# Altium schematic symbol library BARKO_SCHLIB.SchLib: 1064 symbols (part 5 of 11)
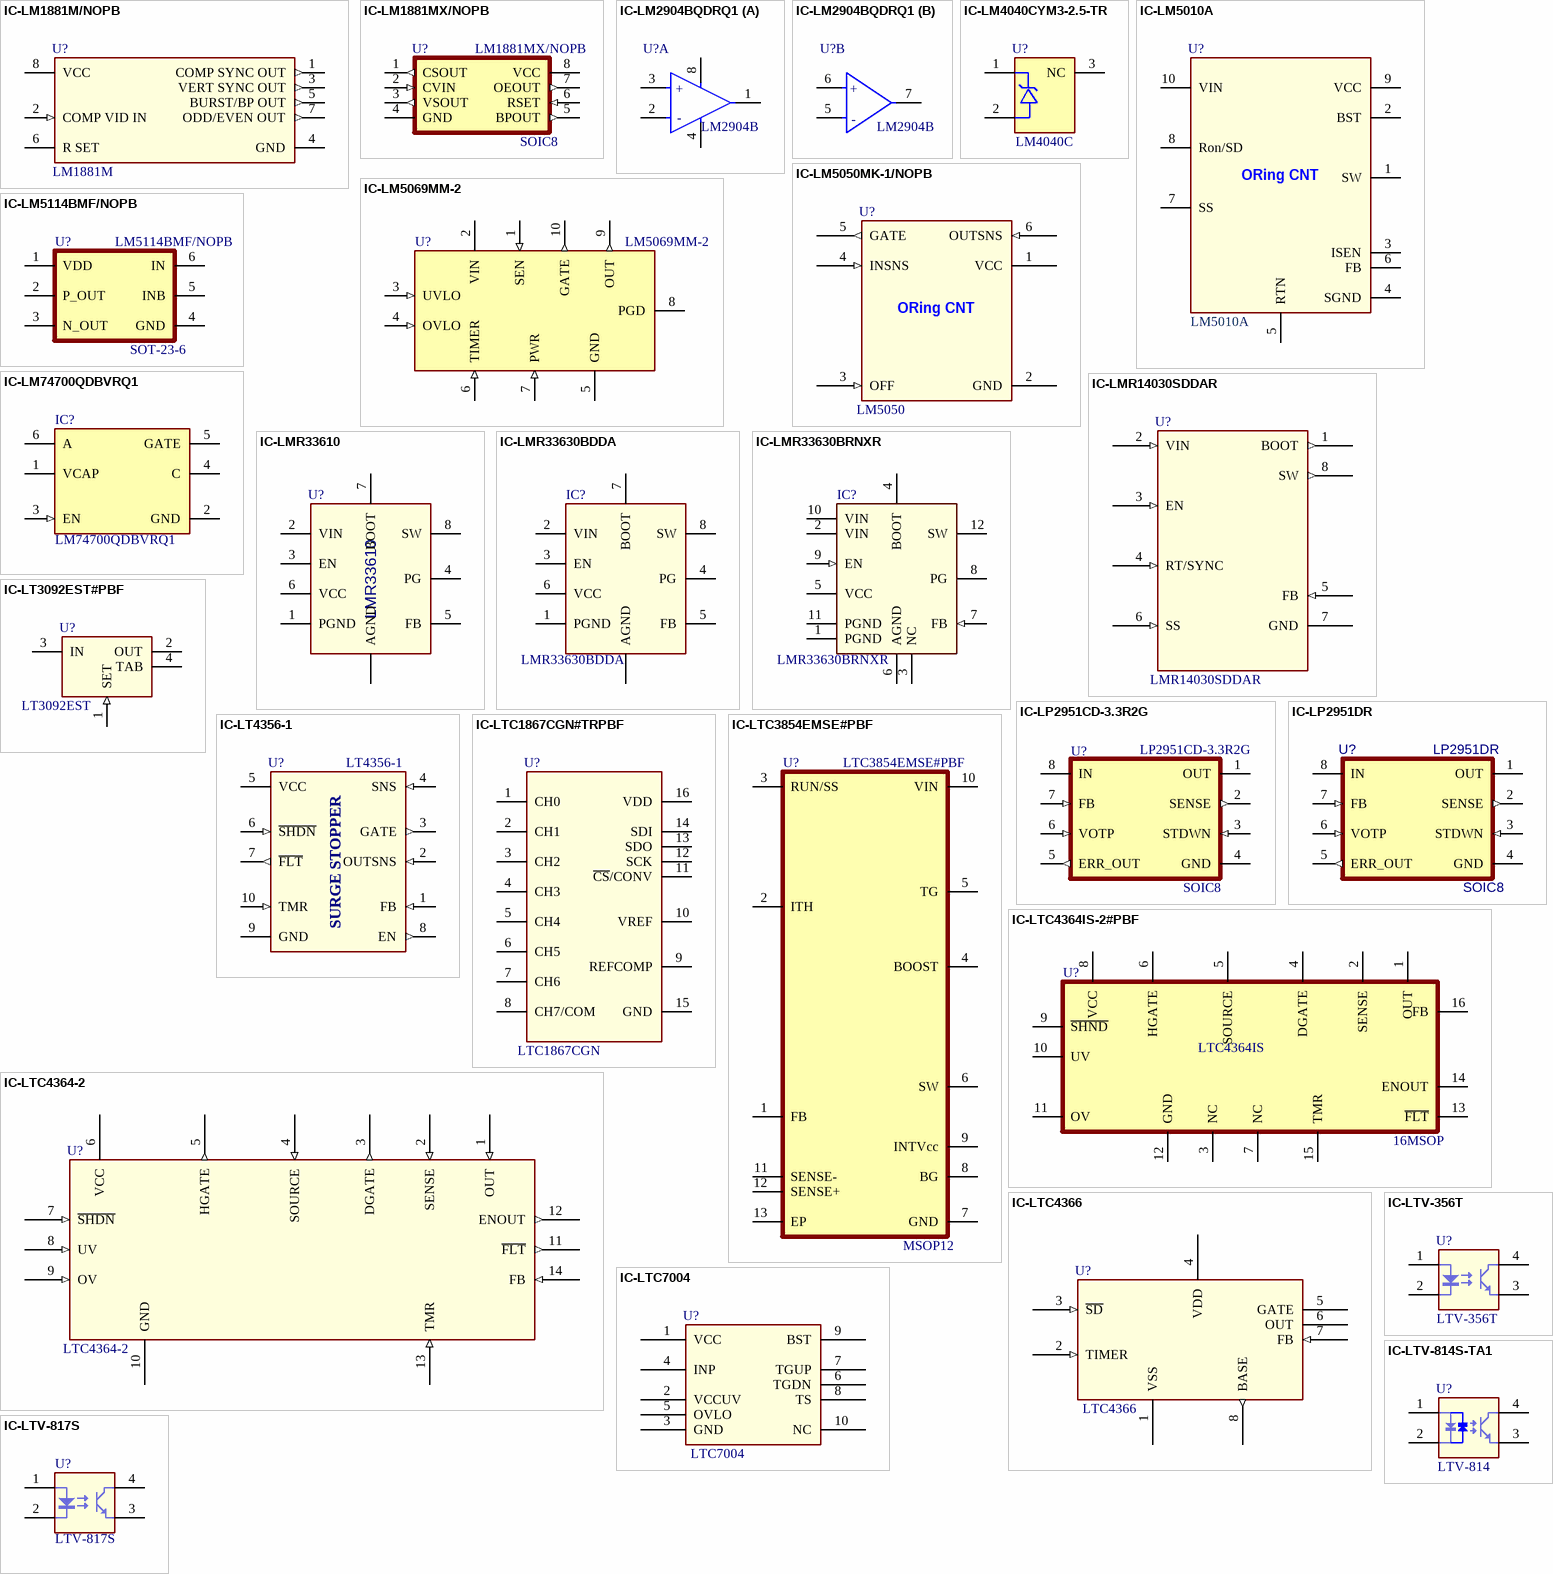
[diagram p45: symbols IC-LM1881M/NOPB to IC-LTV-817S]

## IC-LM4040CYM3-2.5-TR
designator U?, comment LM4040C
IC VREF SHUNT 0.5% SOT23-3; Manufacturer: Microchip; Manufacturer Part Number: LM4040CYM3-2.5-TR; Min Output Voltage: 2.5V; Output Current: 15mA; Temperature Coefficient: 100ppm/°C; Cathode Current: 65uA; Number of Channels: 1; Output Type: Fixed; Supplier 1: Digi-Key; Supplier Part Number 1: 576-1046-1-ND; Stock: 8428; Pricing: 1=0.32, 25=0.26, 100=0.24 (USD); RoHS: Yes; Mount: Surface Mount; Case/Package: TO-236-3; Number of Pins: 3; Min Operating Temperature: -40°C; Max Operating Temperature: 85°C; Packaging: Cut Tape; Reference Voltage: 2.5V; Tolerance: 0.5%; Output Voltage: 2.5V; Reference Type: Shunt; REACH SVHC: No SVHC; Lead Free: Lead Free; ComponentLink1URL: https://datasheet.ciiva.com/16388/mic23051-16388546.pdf?src-supplier=Future+Electronics; ComponentLink1Description: https://datasheet.ciiva.com/16388/mic23051-16388546.pdf?src-supplier=Future+Electronics; ComponentLink2URL: https://datasheet.ciiva.com/1173/1580463-1173207.pdf?src-supplier=Element14; ComponentLink2Description: https://datasheet.ciiva.com/1173/1580463-1173207.pdf?src-supplier=Element14
footprint SOT23-3
pins: 1 +, 2 -, 3 NC

## IC-LM5010A
designator U?, comment LM5010A
IC REG BUCK ADJUSTABLE 1A 10WSON; Manufacturer: TI National Semiconductor; Manufacturer Part Number: LM5010ASD/NOPB; Output Voltage: 70V; Switching Frequency: 1MHz; Number of Outputs: 1; Efficiency: 91%; Min Input Voltage: 6V; Max Input Voltage: 75V; Synchronous Rectifier: No; Min Output Voltage: 2.5V; Quiescent Current: 650uA; Supplier 1: Digi-Key; Stock 1: 6898; Pricing 1: 1=3,43000, 10=3,08000, 25=2,91160, 100=2,39390, 250=2,14804, 500=2,07040 (USD); RoHS: Yes; Mount: Surface Mount; Number of Pins: 10; Contact Plating: Tin,Matte; Min Operating Temperature: -40°C; Max Operating Temperature: 150°C; Max Output Current: 1A; Output Current: 1A; Package Quantity: 1000; Packaging: Tape and Reel; Max Output Voltage: 70V; Output Type: Adjustable; Max Supply Voltage: 75V; Min Supply Voltage: 6V; Frequency: 1MHz; Termination: SMD/SMT; Length: 4mm; Height: 0.8mm; Width: 4mm; Radiation Hardening: No; Lead Free: Lead Free; REACH SVHC: No SVHC; ComponentLink1URL: https://datasheet.ciiva.com/22755/1814939-22755746.pdf?src-supplier=Farnell; ComponentLink1Description: https://datasheet.ciiva.com/22755/1814939-22755746.pdf?src-supplier=Farnell; ComponentLink2URL: https://datasheet.ciiva.com/25627/0900766b810fa582-25627522.pdf?src-supplier=RSComponents; ComponentLink2Description: https://datasheet.ciiva.com/25627/0900766b810fa582-25627522.pdf?src-supplier=RSComponents; ComponentLink3URL: https://datasheet.ciiva.com/27052/1471525-27052267.pdf?src-supplier=Jameco; ComponentLink3Description: https://datasheet.ciiva.com/27052/1471525-27052267.pdf?src-supplier=Jameco; ComponentLink4URL: https://datasheet.ciiva.com/6597/lm5010a-6597237.pdf?src-supplier=Digi-Key; ComponentLink4Description: https://datasheet.ciiva.com/6597/lm5010a-6597237.pdf?src-supplier=Digi-Key; ComponentLink5URL: https://datasheet.ciiva.com/22684/1886233-22684613.pdf?src-supplier=Element14; ComponentLink5Description: https://datasheet.ciiva.com/22684/1886233-22684613.pdf?src-supplier=Element14; ComponentLink6URL: https://datasheet.ciiva.com/6597/lm5010a-6597240.pdf?src-supplier=Digi-Key; ComponentLink6Description: https://datasheet.ciiva.com/6597/lm5010a-6597240.pdf?src-supplier=Digi-Key; ComponentLink7URL: https://datasheet.ciiva.com/3229/lm5010a-3229963.pdf?src-supplier=Avnet; ComponentLink7Description: https://datasheet.ciiva.com/3229/lm5010a-3229963.pdf?src-supplier=Avnet; ComponentLink8URL: https://datasheet.ciiva.com/6597/lm5010a-6597243.pdf?src-supplier=Digi-Key; ComponentLink8Description: https://datasheet.ciiva.com/6597/lm5010a-6597243.pdf?src-supplier=Digi-Key; Supplier Part Number 1: 296-LM5010ASD/NOPBCT-ND
footprint SON80P400X80_HS-11N (SON, 10-Leads, Body 4,00x4,00mm, Pitch 0,80mm, Thermal Pad 3,00x2,09mm, IPC Medium Density)
pins: 1 SW, 2 BST, 3 ISEN, 4 SGND, 5 RTN, 6 FB, 7 SS, 8 Ron/SD, 9 VCC, 10 VIN
text: ORing CNT

## IC-LM5050MK-1/NOPB
designator U?, comment LM5050
IC OR CTRLR N+1 6SOT; Manufacturer: TI National Semiconductor; Manufacturer Part Number: LM5050MK-1/NOPB; Min Supply Voltage: 5V; Max Supply Voltage: 75V; Number of Outputs: 1; Quiescent Current: 400uA; Operating Supply Current: 130uA; Turn-Off Delay Time: 486ns; Output Current: 3.2uA; Washability: OK; Tolerance: 1%; Resistance: 24.9kR; Power Rating: 100mW; Temperature Coefficient: 100ppm/°C; .Creator: M.OZKAN; .PCBCHK: USED; Supplier 1: Digi-Key; Stock 1: 33499; Pricing 1: 1=2.33000, 10=2.09100, 25=1.97240, 100=1.57800, 250=1.38072, 500=1.34126 (USD); RoHS: Yes; Mount: Surface Mount; Case/Package: SOT-23-6; Number of Pins: 6; Min Operating Temperature: -40°C; Max Operating Temperature: 125°C; Packaging: Tape and Reel; Package Quantity: 1000; Nominal Supply Current: 130uA; Number of Drivers: 1; Max Output Current: 3.2uA; Output Voltage: 75V; Radiation Hardening: No; Lead Free: Lead Free; REACH SVHC: No SVHC; ComponentLink1URL: https://datasheet.ciiva.com/22694/1642225-22694320.pdf?src-supplier=Element14; ComponentLink1Description: https://datasheet.ciiva.com/22694/1642225-22694320.pdf?src-supplier=Element14; ComponentLink2URL: https://datasheet.ciiva.com/12085/lm5050-1-122886-12085154.pdf?src-supplier=Mouser; ComponentLink2Description: https://datasheet.ciiva.com/12085/lm5050-1-122886-12085154.pdf?src-supplier=Mouser; ComponentLink3URL: https://datasheet.ciiva.com/1960/lm5050-1-1960856.pdf?src-supplier=Digi-Key; ComponentLink3Description: https://datasheet.ciiva.com/1960/lm5050-1-1960856.pdf?src-supplier=Digi-Key; ComponentLink4URL: https://datasheet.ciiva.com/15110/getdatasheetpartid-319925-15110173.pdf?src-supplier=Verical; ComponentLink4Description: https://datasheet.ciiva.com/15110/getdatasheetpartid-319925-15110173.pdf?src-supplier=Verical; ComponentLink5URL: https://datasheet.ciiva.com/1960/lm5050-1-1960857.pdf?src-supplier=Digi-Key; ComponentLink5Description: https://datasheet.ciiva.com/1960/lm5050-1-1960857.pdf?src-supplier=Digi-Key; ComponentLink6URL: https://datasheet.ciiva.com/1960/lm5050-1-1960858.pdf?src-supplier=Digi-Key; ComponentLink6Description: https://datasheet.ciiva.com/1960/lm5050-1-1960858.pdf?src-supplier=Digi-Key; Supplier Part Number 1: LM5050MK-1/NOPBCT-ND; Stock: 149638; Pricing: 1=0.1, 10=0.016, 100=0.0065, 1000=0.0029, 2500=0.0025 (USD); Case Code (Imperial): 0603; Contact Plating: Tin,Matte; Case Code (Metric): 1608; Composition: Thick Film; Number of Terminations: 2; Max Power Dissipation: 100mW; Features: Automotive AEC-Q200; Length: 0.061inch; Height: 0.022inch; Width: 0.031inch; ComponentLink7URL: http://components.arrow.com/part/dataview/50576347S797719N1174?src-supplier=Arrow; ComponentLink7Description: http://components.arrow.com/part/dataview/50576347S797719N1174?src-supplier=Arrow; ComponentLink8URL: http://www.seielect.com/Catalog/SEI-RMC.pdf?src-supplier=Future+Electronics; ComponentLink8Description: http://www.seielect.com/Catalog/SEI-RMC.pdf?src-supplier=Future+Electronics; ComponentLink9URL: https://www.seielect.com/catalog/SEI-RMCF_RMCP.pdf?src-supplier=Avnet; ComponentLink9Description: https://www.seielect.com/catalog/SEI-RMCF_RMCP.pdf?src-supplier=Avnet; ComponentLink10URL: https://www.seielect.com/catalog/SEI-Packaging.pdf?src-supplier=Digi-Key; ComponentLink10Description: https://www.seielect.com/catalog/SEI-Packaging.pdf?src-supplier=Digi-Key; ComponentLink11URL: https://www.seielect.com/catalog/SEI-RMCF_RMCP.pdf?src-supplier=Avnet+Asia; ComponentLink11Description: https://www.seielect.com/catalog/SEI-RMCF_RMCP.pdf?src-supplier=Avnet+Asia; ComponentLink12URL: https://www.seielect.com/Catalog/SEI-RMCF_RMCP.pdf?src-supplier=Digi-Key; ComponentLink12Description: https://www.seielect.com/Catalog/SEI-RMCF_RMCP.pdf?src-supplier=Digi-Key; .SCHCHK: USED
footprint SOT23-6
pins: 1 VCC (power), 2 GND (power), 3 OFF (in), 4 INSNS (in), 5 GATE (out), 6 OUTSNS (in)
text: ORing CNT

## IC-LM5069MM-2
designator U?, comment LM5069MM-2
Hot Swap Controller 1-CH 80V N-Channel Positive High Voltage 10-Pin VSSOP T/R; Manufacturer: National Semiconductor; Manufacturer Part Number: LM5069MM-2/NOPB; PackageTopMarking: ZXTT*SNBB; PowerWise: N; CompType: MiscPower; High-Reliability: Y; Min Supply Voltage: 9V; Number of Channels: 1; Output Voltage: 12V; Washability: OK; .Creator: M.OZKAN; .PCBCHK: USED; DatasheetVersion: Mar-2008; PackageVersion: revB, Jul-2003; PackageReference: MUB10A; PackageDescription: Mini-SO, Molded, .118 x .118 x .034in Body, 10 Lead, .0197in Pitch; PartNumber: LM5069MM-2; RoHS: N; PinCount: 10; Code_JEDEC: MO-187-BA; ComponentLink1Description: Manufacturer URL; ComponentLink1URL: http://www.national.com/; ComponentLink2Description: LM5069 Datasheet; ComponentLink2URL: http://www.national.com/ds/LM/LM5069.pdf; ComponentLink3Description: LM5069 Web Page; ComponentLink3URL: http://www.national.com/pf/LM/LM5069.html; ComponentLink4Description: MUB10A Package Page; ComponentLink4URL: http://www.national.com/packaging/folders/mub10a.html; Supplier 1: Digi-Key; Stock 1: 60493; Pricing 1: 1 = 3.00000, 10 = 2.69700, 100 = 2.20940, 500 = 1.88078 (USD); Mount: Surface Mount; Case/Package: MSOP; Number of Pins: 10; Min Operating Temperature: -40°C; Max Operating Temperature: 125°C; Packaging: Tape and Reel; Package Quantity: 1000; Max Supply Voltage: 80V; Number of Outputs: 1; Length: 3mm; Height: 0.86mm; Depth: 3.1mm; Width: 3mm; Radiation Hardening: No; Lead Free: Lead Free; REACH SVHC: No SVHC; ComponentLink5URL: https://datasheet.ciiva.com/15099/getdatasheetpartid-628880-15099677.pdf?src-supplier=Verical; ComponentLink5Description: https://datasheet.ciiva.com/15099/getdatasheetpartid-628880-15099677.pdf?src-supplier=Verical; ComponentLink6URL: https://datasheet.ciiva.com/3222/lm5069-3222438.pdf?src-supplier=Avnet; ComponentLink6Description: https://datasheet.ciiva.com/3222/lm5069-3222438.pdf?src-supplier=Avnet; ComponentLink7URL: https://datasheet.ciiva.com/3222/lm5069-3222470.pdf?src-supplier=Avnet; ComponentLink7Description: https://datasheet.ciiva.com/3222/lm5069-3222470.pdf?src-supplier=Avnet; ComponentLink8URL: https://datasheet.ciiva.com/6609/lm5069-6609670.pdf?src-supplier=Digi-Key; ComponentLink8Description: https://datasheet.ciiva.com/6609/lm5069-6609670.pdf?src-supplier=Digi-Key; ComponentLink9URL: https://datasheet.ciiva.com/1511/1642228-1511437.pdf?src-supplier=Element14; ComponentLink9Description: https://datasheet.ciiva.com/1511/1642228-1511437.pdf?src-supplier=Element14; Supplier Part Number 1: LM5069MM-2/NOPBCT-ND; .SCHCHK: USED
footprint MUB10A_N (TSSOP, 10-Leads, Body 3x3mm, Pitch 0.5mm, IPC Medium Density)
footprint MUB10A_L (TSSOP, 10-Leads, Body 3x3mm, Pitch 0.5mm, IPC High Density)
footprint MUB10A_M (TSSOP, 10-Leads, Body 3x3mm, Pitch 0.5mm, IPC Low Density)
pins: 1 SEN (in), 2 VIN (power), 3 UVLO (in), 4 OVLO (in), 5 GND (power), 6 TIMER (in), 7 PWR (in), 8 PGD (oc), 9 OUT (out), 10 GATE (out)

## IC-LM5114BMF/NOPB
designator U?, comment LM5114BMF/NOPB  Case/Package: SOT-23-6
IC MOSFET GATE DVR 7.6A SOT23-6; Manufacturer: TI National Semiconductor; Rise Time: 3.2ns; Propagation Delay: 14ns; Max Supply Voltage: 12.6V; Min Supply Voltage: 4V; Number of Outputs: 2; Channel Type: Single; Number of Drivers: 1; Fall Time: 8ns; .Creator: F:TALI; .PCBCHK: USED; Drain to Source Voltage (Vdss): 100V; Continuous Drain Current (ID): 200A; Rds On Max: 2.4mR; Input Capacitance: 12nF; Max Power Dissipation: 375W; Turn-Off Delay Time: 32ns; Gate to Source Voltage (Vgs): 20V; Washability: OK; Supplier 1: Digi-Key; Manufacturer Part Number: LM5114BMF/NOPB; Stock 1: 14082; Pricing 1: 1=1.6, 10=1.441, 100=1.1584, 500=0.95172 (USD); Mount: Surface Mount; Number of Pins: 6; Min Operating Temperature: -40°C; Max Operating Temperature: 125°C; Max Output Current: 7.6A; Packaging: Tape and Reel; Output Current: 7.6A; Nominal Supply Current: 7.6A; Package Quantity: 1000; Turn-On Delay Time: 14ns; Element Configuration: Single; Number of Channels: 1; REACH SVHC: No SVHC; Lead Free: Lead Free; ComponentLink1URL: http://www.ti.com/lit/ds/symlink/lm5114.pdf?src-supplier=Digi-Key; ComponentLink1Description: http://www.ti.com/lit/ds/symlink/lm5114.pdf?src-supplier=Digi-Key; ComponentLink2URL: http://www.farnell.com/datasheets/1882602.pdf?src-supplier=Element14; ComponentLink2Description: http://www.farnell.com/datasheets/1882602.pdf?src-supplier=Element14; ComponentLink3URL: http://www.farnell.com/datasheets/1604991.pdf?src-supplier=Farnell; ComponentLink3Description: http://www.farnell.com/datasheets/1604991.pdf?src-supplier=Farnell; Supplier Part Number 1: LM5114BMF/NOPBDKR-ND; .SCHCHK: USED; RoHS: Yes; Contact Plating: Tin; ComponentLink4URL: http://www.ti.com/lit/ds/symlink/csd19536ktt.pdf?src-supplier=Digi-Key; ComponentLink4Description: http://www.ti.com/lit/ds/symlink/csd19536ktt.pdf?src-supplier=Digi-Key; ComponentLink5URL: http://www.ti.com/general/docs/lit/getliterature.tsp?genericPartNumber=CSD19536KTT&&fileType=pdf&src-supplier=Avnet; ComponentLink5Description: http://www.ti.com/general/docs/lit/getliterature.tsp?genericPartNumber=CSD19536KTT&&fileType=pdf&src-supplier=Avnet; ComponentLink6URL: http://www.ti.com/lit/gpn/csd19536ktt?src-supplier=Mouser; ComponentLink6Description: http://www.ti.com/lit/gpn/csd19536ktt?src-supplier=Mouser
footprint SOT23-6
pins: 1 VDD (power), 2 P_OUT, 3 N_OUT, 4 GND, 5 INB, 6 IN

## IC-LM74700QDBVRQ1
designator IC?, comment LM74700QDBVRQ1
Low Iq, ideal diode controller 6-SOT-23 -40 to 125; Manufacturer: Texas Instruments; Supplier 1: Arrow; Manufacturer Part Number: LM74700QDBVRQ1; Stock 1: 75000; Pricing 1: 3000=0,81160, 6000=0,77810, 9000=0,75810, 3000=0,82740, 6000=0,79130, 9000=0,77010, 3000=0,99430, 30000=0,98380, 300000=0,92110, 1500000=0,88660, 3000000=0,88620 (USD); RoHS: No; Min Operating Temperature: -40°C; Max Operating Temperature: 125°C; Supplier Part Number 1: LM74700QDBVRQ1
footprint SOT23-6 - LM74700 (LM74700)
pins: 1 VCAP (power), 2 GND (power), 3 EN (in), 4 C, 5 GATE, 6 A

## IC-LMR14030SDDAR
designator U?, comment LMR14030SDDAR
IC REG BUCK ADJ 3.5A 8SOPWR; MF: Texas Instruments; Quiescent Current: 40uA; Switching Frequency: 2.5MHz; Output Voltage: 28V; Number of Outputs: 1; Min Input Voltage: 4V; Max Input Voltage: 40V; Output Type: Adjustable; Price: None; Package: HSOIC-8 Texas Instruments; MP: LMR14030SDDAR; Availability: Good; Supplier 1: Digi-Key; Manufacturer: Texas Instruments; Manufacturer Part Number: LMR14030SDDAR; Stock 1: 7894; Pricing 1: 1=2,73000, 10=2,44900, 25=2,31000, 100=1,84800, 250=1,61700, 500=1,57080, 1000=1,24740 (USD); RoHS: Yes; Mount: Surface Mount; Number of Pins: 8; Contact Plating: Gold,Silver; Min Operating Temperature: -40°C; Max Operating Temperature: 125°C; Max Output Current: 3.5A; Operating Supply Voltage: 40V; Lead Free: Lead Free; ComponentLink1URL: http://www.ti.com/general/docs/lit/getliterature.tsp?genericPartNumber=LMR14030&&fileType=pdf&src-supplier=Avnet; ComponentLink1Description: http://www.ti.com/general/docs/lit/getliterature.tsp?genericPartNumber=LMR14030&&fileType=pdf&src-supplier=Avnet; ComponentLink2URL: http://www.ti.com/lit/ds/symlink/lmr14030.pdf?src-supplier=Digi-Key; ComponentLink2Description: http://www.ti.com/lit/ds/symlink/lmr14030.pdf?src-supplier=Digi-Key; ComponentLink3URL: http://www.ti.com/general/docs/suppproductinfo.tsp?distId=10&amp;gotoUrl=http%3A%2F%2Fwww.ti.com%2Flit%2Fgpn%2Flmr14030&src-supplier=Digi-Key; ComponentLink3Description: http://www.ti.com/general/docs/suppproductinfo.tsp?distId=10&amp;gotoUrl=http%3A%2F%2Fwww.ti.com%2Flit%2Fgpn%2Flmr14030&src-supplier=Digi-Key; ComponentLink4URL: http://www.ti.com/general/docs/lit/getliterature.tsp?genericPartNumber=LMR14030&amp;&amp;fileType=pdf&src-supplier=Avnet+Asia; ComponentLink4Description: http://www.ti.com/general/docs/lit/getliterature.tsp?genericPartNumber=LMR14030&amp;&amp;fileType=pdf&src-supplier=Avnet+Asia; Supplier Part Number 1: 296-44321-1-ND
footprint SOIC127P600X170_HS-9N (SOIC, 8-Leads, Body 4,90x3,90mm, Pitch 1,27mm, Thermal Pad 3,10x2,40mm, IPC Medium Density)
pins: 1 BOOT (out), 2 VIN (in), 3 EN (in), 4 RT/SYNC (in), 5 FB (in), 6 SS (in), 7 GND (power), 8 SW (out)

## IC-LMR33610
designator U?, comment LMR33610
36V 1A 1.4MHZ REGULATOR; Manufacturer: Texas Instruments; Manufacturer Part Number: LMR33610BDDAR; .Creator: M.OZKAN; .PCBCHK: USED; Supplier 1: Digi-Key; Supplier Part Number 1: 296-LMR33610BDDARCT-ND; Stock: 2245; Pricing: 1=1.77, 10=1.59, 25=1.5, 100=1.2, 250=1.05, 500=1.02, 1000=0.81 (USD); RoHS: No; .SCHCHK: USED; ComponentLink1Description: datasheet; ComponentLink1URL: https://www.ti.com/lit/ds/symlink/lmr33610.pdf?HQS=TI-null-null-digikeymode-df-pf-null-wwe&ts=1604939284459
footprint SOIC8-EP (SOIC, 8-Leads, Body 5x4mm, Pitch 1.27mm, IPC Low Density)
pins: 1 PGND, 2 VIN, 3 EN, 4 PG, 5 FB, 6 VCC, 7 BOOT, 8 SW, EP AGND

## IC-LMR33630BDDA
designator IC?, comment LMR33630BDDA
SIMPLE SWITCHER 3.8V TO 36V, 3A; Manufacturer: Texas Instruments; Output Type: Adjustable; Output Configuration: Positive; Number of Outputs: 1; Min Output Voltage: 1V; Max Output Voltage: 24V; Switching Frequency: 1.4MHz; Synchronous Rectifier: Yes; Supplier 1: Mouser; Manufacturer Part Number: LMR33630BDDA; Stock 1: 299; Pricing 1: 1=2,65000, 10=2,24000, 100=1,80000, 250=1,57000, 500=1,53000, 1000=1,21000 (USD); RoHS: No; Mount: Surface Mount; Number of Pins: 8; Min Operating Temperature: -40°C; Max Operating Temperature: 125°C; Packaging: Rail/Tube; Min Input Voltage: 3.8V; Max Input Voltage: 36V; Output Current: 3A; ComponentLink1URL: http://www.ti.com/lit/ds/symlink/lmr33630.pdf?src-supplier=Digi-Key; ComponentLink1Description: http://www.ti.com/lit/ds/symlink/lmr33630.pdf?src-supplier=Digi-Key; Supplier Part Number 1: 595-LMR33630BDDA
footprint SOIC8-EP (SOIC, 8-Leads, Body 5x4mm, Pitch 1.27mm, IPC Low Density)
pins: 1 PGND, 2 VIN, 3 EN, 4 PG, 5 FB, 6 VCC, 7 BOOT, 8 SW, EP AGND

## IC-LMR33630BRNXR
designator IC?, comment LMR33630BRNXR
SIMPLE SWITCHER® 3.8V to 36V, 3A Synchronous Buck Converter With Ultra-Low EMI 12-VQFN-HR -40 to 125; Manufacturer: Texas Instruments; Output Type: Adjustable; Output Configuration: Positive; Number of Outputs: 1; Min Output Voltage: 1V; Max Output Voltage: 24V; Switching Frequency: 1.4MHz; Synchronous Rectifier: Yes; Supplier 1: Arrow; Manufacturer Part Number: LMR33630BRNXR; Stock 1: 3000; Pricing 1: 3000=0,89540, 1=2,16400, 10=1,86100, 25=1,82200, 100=1,81300, 250=1,80500, 500=1,79600, 1000=1,78700, 3000=0,99750, 30000=0,98590, 300000=0,91760, 1500000=0,88120, 3000000=0,88090 (USD); RoHS: No; Mount: Surface Mount; Case/Package: VQFN; Number of Pins: 12; Min Operating Temperature: -40°C; Max Operating Temperature: 125°C; Packaging: Cut Tape; Min Input Voltage: 3.8V; Max Input Voltage: 36V; Output Current: 3A; ComponentLink1URL: http://www.ti.com/lit/ds/symlink/lmr33630.pdf?src-supplier=Digi-Key; ComponentLink1Description: http://www.ti.com/lit/ds/symlink/lmr33630.pdf?src-supplier=Digi-Key; Supplier Part Number 1: LMR33630BRNXR
footprint VQFN-HR-12 (RNX0012B)
pins: 1 PGND (power), 2 VIN (power), 3 NC, 4 BOOT, 5 VCC (power), 6 AGND (power), 7 FB (in), 8 PG (oc), 9 EN (in), 10 VIN (power), 11 PGND (power), 12 SW (power)

## IC-LP2951CD-3.3R2G
designator U?, comment LP2951CD-3.3R2G  Case/Package: SOIC8
IC REG LINEAR 3.3V 100MA 8SOIC; Manufacturer: ON Semiconductor; Max Input Voltage: 30V; Number of Outputs: 1; Dropout Voltage: 350mV; Min Input Voltage: 4.3V; Input Bias Current: 75uA; Reference Voltage: 1.26V; Polarity: Positive; Accuracy: 1%; Output Type: Fixed; .Creator: F:TALI; .PCBCHK: USED; Washability: OK; Supplier 1: Digi-Key; Manufacturer Part Number: LP2951CD-3.3R2G; Stock 1: 2160; Pricing 1: 1=0.52, 10=0.444, 100=0.3317, 500=0.2606, 1000=0.20137 (USD); Mount: Surface Mount; Number of Pins: 8; Contact Plating: Matte,Tin; Min Operating Temperature: -40°C; Max Operating Temperature: 125°C; Max Output Current: 100mA; Output Voltage: 3.3V; Packaging: Tape and Reel; Output Current: 100mA; Nominal Output Voltage: 3.3V; Package Quantity: 1; Number of Regulators: 1; Min Output Voltage: 3.3V; Quiescent Current: 75uA; Output Voltage Accuracy: 1%; Length: 5mm; Height: 1.5mm; Width: 4mm; Radiation Hardening: No; REACH SVHC: No SVHC; Lead Free: Lead Free; Halogen Free: Halogen Free; ComponentLink1URL: http://www.onsemi.com/pub/Collateral/LP2950-D.PDF; ComponentLink1Description: http://www.onsemi.com/pub/Collateral/LP2950-D.PDF; ComponentLink2URL: https://www.alliedelec.com/m/d/1d3b576a6ffe6978fe274d93b947e751.PDF; ComponentLink2Description: https://www.alliedelec.com/m/d/1d3b576a6ffe6978fe274d93b947e751.PDF; ComponentLink3URL: http://www.onsemi.jp/pub/Collateral/LP2950-D.PDF; ComponentLink3Description: http://www.onsemi.jp/pub/Collateral/LP2950-D.PDF; Supplier Part Number 1: LP2951CD-3.3R2GOSDKR-ND; .SCHCHK: USED
footprint SOIC8
pins: 1 OUT, 2 SENSE (out), 3 STDWN (in), 4 GND (power), 5 ERR_OUT (out), 6 VOTP (in), 7 FB (in), 8 IN (power)

## IC-LP2951DR
designator U?, comment LP2951DR  Case/Package: SOIC8
IC REG LDO 5V/ADJ 0.1A 8SOIC; Manufacturer: Texas Instruments; Output Current: 100mA; Dropout Voltage: 380mV; Number of Outputs: 1; Output Voltage: 30V; Min Input Voltage: 2V; Reference Voltage: 1.252V; Polarity: Positive; Min Output Voltage: 1.2V; Max Output Voltage: 29V; Output Voltage Accuracy: 1.4%; Quiescent Current: 75uA; Output Type: Adjustable; .PCBCHK: USED; .Creator: F:TALI; Washability: OK; Supplier 1: Digi-Key; Manufacturer Part Number: LP2951DR; Stock 1: 29021; Pricing 1: 1=0.6, 10=0.527, 100=0.4039, 500=0.3193, 1000=0.25544 (USD); Number of Pins: 8; Contact Plating: Gold; Min Operating Temperature: -40°C; Max Operating Temperature: 125°C; Package Quantity: 1; Max Output Current: 100mA; Packaging: Tape and Reel; Max Input Voltage: 30V; Accuracy: 1.4%; Number of Regulators: 1; Input Bias Current: 75uA; Radiation Hardening: No; Lead Free: Lead Free; REACH SVHC: No SVHC; ComponentLink1URL: http://www.farnell.com/datasheets/1837623.pdf; ComponentLink1Description: http://www.farnell.com/datasheets/1837623.pdf; ComponentLink2URL: https://www.verical.com/server-webapp/html/getDatasheet?partID=111801; ComponentLink2Description: https://www.verical.com/server-webapp/html/getDatasheet?partID=111801; ComponentLink3URL: http://www.ti.com/lit/ds/symlink/lp2951.pdf; ComponentLink3Description: http://www.ti.com/lit/ds/symlink/lp2951.pdf; ComponentLink4URL: http://focus.ti.com/lit/ds/symlink/lp2951-33.pdf; ComponentLink4Description: http://focus.ti.com/lit/ds/symlink/lp2951-33.pdf; ComponentLink5URL: http://www.ti.com/general/docs/lit/getliterature.tsp?genericPartNumber=LP2950-50&&fileType=pdf; ComponentLink5Description: http://www.ti.com/general/docs/lit/getliterature.tsp?genericPartNumber=LP2950-50&&fileType=pdf; ComponentLink6URL: http://www.produktinfo.conrad.com/datenblaetter/1000000-1099999/001014286-da-01-en-IC_REG_LDO_ADJ_0_1A_LP2951DR_SOIC_8_TID.pdf; ComponentLink6Description: http://www.produktinfo.conrad.com/datenblaetter/1000000-1099999/001014286-da-01-en-IC_REG_LDO_ADJ_0_1A_LP2951DR_SOIC_8_TID.pdf; Supplier Part Number 1: 296-22748-6-ND; .SCHCHK: USED
footprint SOIC8
pins: 1 OUT, 2 SENSE (out), 3 STDWN (in), 4 GND (power), 5 ERR_OUT (out), 6 VOTP (in), 7 FB (in), 8 IN (power)

## IC-LT3092EST#PBF
designator U?, comment LT3092EST
IC CURRENT SOURCE 1% SOT223-3; Manufacturer: Analog Devices / Linear Technology; Manufacturer Part Number: LT3092EST#PBF; Operating Supply Current: 300uA; Output Current: 200mA; Max Input Voltage: 40V; Min Input Voltage: 1.2V; Element Configuration: Single; Supplier 1: Digi-Key; Supplier Part Number 1: LT3092EST#PBF-ND; Stock: 7965; Pricing: 1=4.35, 25=2.5, 100=2.407 (USD); RoHS: Yes; Case/Package: SOT-223; Number of Pins: 3; Min Operating Temperature: -40°C; Max Operating Temperature: 125°C; Accuracy: 1%; Packaging: Rail/Tube; Package Quantity: 78; Max Supply Voltage: 40V; Min Supply Voltage: 1.2V; Length: 6.71mm; Height: 1.8mm; Width: 3.71mm; Radiation Hardening: No; REACH SVHC: No SVHC; ComponentLink1URL: https://datasheet.ciiva.com/30476/0900766b81222c60-30476408.pdf?src-supplier=RSComponents; ComponentLink1Description: https://datasheet.ciiva.com/30476/0900766b81222c60-30476408.pdf?src-supplier=RSComponents; ComponentLink2URL: https://datasheet.ciiva.com/1939/27892-1939524.pdf?src-supplier=Digi-Key; ComponentLink2Description: https://datasheet.ciiva.com/1939/27892-1939524.pdf?src-supplier=Digi-Key; ComponentLink3URL: https://datasheet.ciiva.com/22617/1684142-22617222.pdf?src-supplier=Element14; ComponentLink3Description: https://datasheet.ciiva.com/22617/1684142-22617222.pdf?src-supplier=Element14; ComponentLink4URL: https://datasheet.ciiva.com/22620/1684142-22620647.pdf?src-supplier=Farnell; ComponentLink4Description: https://datasheet.ciiva.com/22620/1684142-22620647.pdf?src-supplier=Farnell; ComponentLink5URL: https://datasheet.ciiva.com/14094/lt3092-eng-ds-14094524.pdf?src-supplier=Distrelec; ComponentLink5Description: https://datasheet.ciiva.com/14094/lt3092-eng-ds-14094524.pdf?src-supplier=Distrelec; ComponentLink6URL: https://datasheet.ciiva.com/7095/1684142-7095838.pdf?src-supplier=Newark; ComponentLink6Description: https://datasheet.ciiva.com/7095/1684142-7095838.pdf?src-supplier=Newark; ComponentLink7URL: https://datasheet.ciiva.com/22621/1684142-22621566.pdf?src-supplier=Element14; ComponentLink7Description: https://datasheet.ciiva.com/22621/1684142-22621566.pdf?src-supplier=Element14; ComponentLink8URL: https://datasheet.ciiva.com/48696/001255695-da-01-en-ic-current-s-lt3092est-pbf-sot-223-3-ltc-48696213.pdf?src-supplier=Conrad; ComponentLink8Description: https://datasheet.ciiva.com/48696/001255695-da-01-en-ic-current-s-lt3092est-pbf-sot-223-3-ltc-48696213.pdf?src-supplier=Conrad
footprint SOT223 (SOT,2.30mm pitch;4 pin,3.50mm W X 6.50mm L X 1.70mm H body)
pins: 1 SET (in) "This pin is the error amplifier’s noninverting input and also sets the operating bias point of the circuit. A fixed 10uA current source flows out of this pin. Two resistors program IOUT as a function of the resistor rati(See Datasheet)", 2 OUT (power) "This is the power output of the device. The minimum current source value to which the device can be set is 0.5mA or the device will not regulate.", 3 IN (power) "This pin supplies power to bias internal circuitry and supply output load current. For the device to operate properly and regulate, the voltage on this pin must be 1.2V to 1.4V above the OUT pin (depending on output load (See Datasheet)", 4 TAB (power)

## IC-LT4356-1
designator U?, comment LT4356-1
IC OVERVOLT PROT REG 10-MSOP; Manufacturer: Analog Devices / Linear Technology; Manufacturer Part Number: LT4356CMS-1#PBF; Number of Channels: 1; Min Supply Voltage: 4V; Max Supply Voltage: 80V; Clamping Voltage: 27V; Washability: OK; .Creator: M.OZKAN; .PCBCHK: USED; Supplier 1: Digi-Key; Stock 1: 2207; Pricing 1: 1=4.79000, 25=3.18320, 100=2.63200, 250=2.50040, 500=2.44400 (USD); RoHS: Yes; Case/Package: MSOP; Number of Pins: 10; Min Operating Temperature: 0°C; Max Operating Temperature: 70°C; Packaging: Rail/Tube; Package Quantity: 50; Working Voltage: 80V; Number of Circuits: 1; Length: 3mm; Height: 0.86mm; Width: 3mm; Depth: 3mm; Radiation Hardening: No; REACH SVHC: No SVHC; ComponentLink1URL: https://datasheet.ciiva.com/15222/getdatasheetpartid-373232-15222325.pdf?src-supplier=Verical; ComponentLink1Description: https://datasheet.ciiva.com/15222/getdatasheetpartid-373232-15222325.pdf?src-supplier=Verical; ComponentLink2URL: https://datasheet.ciiva.com/329/25228-329686.pdf?src-supplier=Digi-Key; ComponentLink2Description: https://datasheet.ciiva.com/329/25228-329686.pdf?src-supplier=Digi-Key; ComponentLink3URL: https://datasheet.ciiva.com/1511/1599513-1511303.pdf?src-supplier=Element14; ComponentLink3Description: https://datasheet.ciiva.com/1511/1599513-1511303.pdf?src-supplier=Element14; ComponentLink4URL: https://datasheet.ciiva.com/1568/1599513-1568893.pdf?src-supplier=Farnell; ComponentLink4Description: https://datasheet.ciiva.com/1568/1599513-1568893.pdf?src-supplier=Farnell; Supplier Part Number 1: LT4356CMS-1#PBF-ND; .SCHCHK: USED
footprint MSOP10 (TSSOP, 10-Leads, Body 3,00x3,00mm, Pitch 0,50mm, IPC Medium Density)
pins: 1 FB (in), 2 OUTSNS (in), 3 GATE (out), 4 SNS (in), 5 VCC (power), 6 ~{SHDN} (in), 7 ~{FLT} (out), 8 EN (out), 9 GND (power), 10 TMR (in)
1 alternate drawing of the same symbol
text: SURGE STOPPER

## IC-LTC1867CGN#TRPBF
designator U?, comment LTC1867CGN
IC ADC 16BIT 8CH 200KSPS 16SSOP; Manufacturer: Analog Devices / Linear Technology; Manufacturer Part Number: LTC1867CGN#TRPBF; Number of Bits: 16; Sampling Rate: 200000S/s; Operating Supply Voltage: 5V; Interface: SPI,Serial; Supply Type: Single; Integral Nonlinearity (INL): 4LSB; Number of Converters: 1; Resolution: 16b; Polarity: Bipolar,Unipolar; Power Dissipation: 9mW; Min Supply Voltage: 4.75V; Max Supply Voltage: 5.25V; Supplier 1: Digi-Key; Supplier Part Number 1: LTC1867CGN#TRPBFDKR-ND; Stock: 4135; Pricing: 1=18.92, 25=11.308, 100=10.388, 250=9.8686 (USD); RoHS: Yes; Mount: Surface Mount; Case/Package: SSOP; Number of Pins: 16; Min Operating Temperature: 0°C; Max Operating Temperature: 70°C; Package Quantity: 2500; Number of Elements: 1; Packaging: Tape and Reel; Max Power Dissipation: 9mW; Lead Free: Lead Free; ComponentLink1URL: https://datasheet.ciiva.com/26798/ltc1867cgn-trpbf-26798574.pdf?src-supplier=IIIC; ComponentLink1Description: https://datasheet.ciiva.com/26798/ltc1867cgn-trpbf-26798574.pdf?src-supplier=IIIC; ComponentLink2URL: https://datasheet.ciiva.com/1287/2141-1287834.pdf?src-supplier=Digi-Key; ComponentLink2Description: https://datasheet.ciiva.com/1287/2141-1287834.pdf?src-supplier=Digi-Key
footprint SSOP16
pins: 1 CH0, 2 CH1, 3 CH2, 4 CH3, 5 CH4, 6 CH5, 7 CH6, 8 CH7/COM, 9 REFCOMP, 10 VREF, 11 ~{CS}/CONV, 12 SCK, 13 SDO, 14 SDI, 15 GND, 16 VDD

## IC-LTC3854EMSE#PBF
designator U?, comment LTC3854EMSE#PBF  Case/Package: MSOP12
IC REG CTRLR BUCK 12MSOP; Manufacturer: Analog Devices / Linear Technology; Output Voltage: 5.5V; Output Current: 25A; Number of Outputs: 1; Max Frequency: 440kHz; Duty Cycle: 98%; Washability: OK; .Creator: M.OZKAN; .PCBCHK: USED; Supplier 1: Digi-Key; Manufacturer Part Number: LTC3854EMSE#PBF; Stock 1: 319; Pricing 1: 1=4,00000, 25=2,65840, 100=2,19800 (USD); RoHS: Yes; Number of Pins: 12; Min Operating Temperature: -40°C; Max Operating Temperature: 85°C; Package Quantity: 37; Packaging: Rail/Tube; ComponentLink1URL: https://datasheet.ciiva.com/2015/27999-2015105.pdf?src-supplier=Digi-Key; ComponentLink1Description: https://datasheet.ciiva.com/2015/27999-2015105.pdf?src-supplier=Digi-Key; Supplier Part Number 1: LTC3854EMSE#PBF-ND; .SCHCHK: USED
footprint MSOP12
pins: 1 FB, 2 ITH, 3 RUN/SS, 4 BOOST, 5 TG, 6 SW, 7 GND, 8 BG, 9 INTVcc, 10 VIN, 11 SENSE-, 12 SENSE+, 13 EP

## IC-LTC4364-2
designator U?, comment LTC4364-2
IC SURGE STOPPER W/DIODE 14DFN; Manufacturer: Analog Devices / Linear Technology; Manufacturer Part Number: LTC4364IDE-2#PBF; Min Supply Voltage: 4V; Max Supply Voltage: 80V; Nominal Supply Current: 370uA; Number of Circuits: 1; Supplier 1: Digi-Key; Stock 1: 1857; Pricing 1: 1=9,89000, 25=5,67000, 100=5,46650 (USD); RoHS: Yes; Case/Package: DFN; Number of Pins: 14; Min Operating Temperature: -40°C; Max Operating Temperature: 85°C; Package Quantity: 91; Packaging: Rail/Tube; Working Voltage: 80V; REACH SVHC: No SVHC; Lead Free: Lead Free; ComponentLink1URL: https://datasheet.ciiva.com/26918/getdatasheetpartid-756223-26918191.pdf?src-supplier=Verical; ComponentLink1Description: https://datasheet.ciiva.com/26918/getdatasheetpartid-756223-26918191.pdf?src-supplier=Verical; ComponentLink2URL: https://datasheet.ciiva.com/7993/1648693-7993621.pdf?src-supplier=Element14; ComponentLink2Description: https://datasheet.ciiva.com/7993/1648693-7993621.pdf?src-supplier=Element14; ComponentLink3URL: https://datasheet.ciiva.com/5698/1648693-5698662.pdf?src-supplier=Farnell; ComponentLink3Description: https://datasheet.ciiva.com/5698/1648693-5698662.pdf?src-supplier=Farnell; ComponentLink4URL: https://datasheet.ciiva.com/14171/ltc4364-1-2-eng-tds-14171350.pdf?src-supplier=Distrelec; ComponentLink4Description: https://datasheet.ciiva.com/14171/ltc4364-1-2-eng-tds-14171350.pdf?src-supplier=Distrelec; Supplier Part Number 1: LTC4364IDE-2#PBF-ND
footprint DFN-14 (4x3)
pins: 1 OUT (in), 2 SENSE (in), 3 DGATE (out), 4 SOURCE (in), 5 HGATE (out), 6 VCC, 7 ~{SHDN} (in), 8 UV (in), 9 OV (in), 10 GND, 11 ~{FLT} (out), 12 ENOUT (out), 13 TMR (in), 14 FB (in)

## IC-LTC4364IS-2#PBF
designator U?, comment LTC4364IS  Case/Package: 16MSOP
IC SURGE STOPPER W/DIODE SMD; Manufacturer: Analog Devices / Linear Technology; Manufacturer Part Number: LTC4364IS-2#PBF; Min Supply Voltage: 4V; Max Supply Voltage: 80V; Nominal Supply Current: 370uA; Number of Circuits: 1; .Creator: F:TALI; .PCBCHK: USED; Forward Current: 1.16A; Max Repetitive Reverse Voltage (Vrrm): 40V; Peak Non-Repetitive Surge Current: 22A; Element Configuration: Single; Peak Reverse Current: 20uA; Forward Voltage: 660mV; Reverse Recovery Time: 5ns; Power Dissipation: 625mW; Polarity: Standard; Current Rating: 1.6A; Capacitance: 26pF; Washability: OK; Supplier 1: Digi-Key; Stock 1: 1433; Pricing 1: 1=8.64, 25=5.7832 (USD); Number of Pins: 16; Min Operating Temperature: -40°C; Max Operating Temperature: 85°C; Package Quantity: 50; Packaging: Rail/Tube; Working Voltage: 80V; REACH SVHC: No SVHC; Lead Free: Lead Free; ComponentLink1URL: http://www.farnell.com/datasheets/1648693.pdf; ComponentLink1Description: http://www.farnell.com/datasheets/1648693.pdf; ComponentLink2URL: https://www.distrelec.biz/Web/Downloads/_t/ds/ltc4364_1-2_eng_tds.pdf?mime=application%2Fpdf; ComponentLink2Description: https://www.distrelec.biz/Web/Downloads/_t/ds/ltc4364_1-2_eng_tds.pdf?mime=application%2Fpdf; Supplier Part Number 1: LTC4364IS-2#PBF-ND; .SCHCHK: USED; Supplier 2: Future Electronics; Stock 2: 600; Pricing 2: 1=0,58000, 250=0,33500, 500=0,31500, 750=0,30500, 1500=0,28500 (USD); RoHS: Yes; Mount: Surface Mount; Weight: 0.000282oz; Contact Plating: Tin,Matte; Average Rectified Current: 1.16A; Max Forward Surge Current (Ifsm): 22A; Max Reverse Voltage (DC): 40V; Termination: SMD/SMT; Voltage Rating (DC): 40V; Output Current: 1.16A; Max Power Dissipation: 625mW; Length: 3.05mm; Height: 1mm; Width: 1.4mm; Radiation Hardening: No; ComponentLink3URL: https://datasheet.ciiva.com/914/zlls1000-914640.pdf?src-supplier=Digi-Key; ComponentLink3Description: https://datasheet.ciiva.com/914/zlls1000-914640.pdf?src-supplier=Digi-Key; ComponentLink4URL: https://datasheet.ciiva.com/5794/1643157-5794548.pdf?src-supplier=Farnell; ComponentLink4Description: https://datasheet.ciiva.com/5794/1643157-5794548.pdf?src-supplier=Farnell; ComponentLink5URL: https://datasheet.ciiva.com/914/zlls1000-914641.pdf?src-supplier=Digi-Key; ComponentLink5Description: https://datasheet.ciiva.com/914/zlls1000-914641.pdf?src-supplier=Digi-Key; ComponentLink6URL: https://datasheet.ciiva.com/914/zlls1000-914642.pdf?src-supplier=Digi-Key; ComponentLink6Description: https://datasheet.ciiva.com/914/zlls1000-914642.pdf?src-supplier=Digi-Key; ComponentLink7URL: https://datasheet.ciiva.com/5794/1643157-5794549.pdf?src-supplier=Farnell; ComponentLink7Description: https://datasheet.ciiva.com/5794/1643157-5794549.pdf?src-supplier=Farnell; ComponentLink8URL: https://datasheet.ciiva.com/4715/zlls1000-4715592.pdf?src-supplier=Mouser; ComponentLink8Description: https://datasheet.ciiva.com/4715/zlls1000-4715592.pdf?src-supplier=Mouser; ComponentLink9URL: https://datasheet.ciiva.com/7964/1643157-7964364.pdf?src-supplier=Element14; ComponentLink9Description: https://datasheet.ciiva.com/7964/1643157-7964364.pdf?src-supplier=Element14; Supplier Part Number 2: ZLLS1000TA-CUTT
footprint MSOP16
pins: 1 OUT, 2 SENSE, 3 NC, 4 DGATE, 5 SOURCE, 6 HGATE, 7 NC, 8 VCC, 9 ~{SHND}, 10 UV, 11 OV, 12 GND, 13 ~{FLT}, 14 ENOUT, 15 TMR, 16 FB

## IC-LTC4366
designator U?, comment LTC4366
IC SURGE STOPPER HV 8-DFN; Manufacturer: Analog Devices / Linear Technology; Manufacturer Part Number: LTC4366IDDB-2#TRMPBF; Min Supply Voltage: 9V; Max Supply Voltage: 500V; Number of Circuits: 1; Supplier 1: Digi-Key; Stock 1: 1364; Pricing 1: 1=7,74000, 25=4,36000, 100=4,27750 (USD); RoHS: Yes; Case/Package: DFN; Number of Pins: 8; Min Operating Temperature: -40°C; Max Operating Temperature: 85°C; Package Quantity: 500; Packaging: Tape and Reel; Working Voltage: 9V; REACH SVHC: No SVHC; Lead Free: Lead Free; ComponentLink1URL: https://datasheet.ciiva.com/1641/1526550-1641474.pdf?src-supplier=Newark; ComponentLink1Description: https://datasheet.ciiva.com/1641/1526550-1641474.pdf?src-supplier=Newark; ComponentLink2URL: https://datasheet.ciiva.com/1511/1747527-1511397.pdf?src-supplier=Element14; ComponentLink2Description: https://datasheet.ciiva.com/1511/1747527-1511397.pdf?src-supplier=Element14; ComponentLink3URL: https://datasheet.ciiva.com/1569/1747527-1569238.pdf?src-supplier=Farnell; ComponentLink3Description: https://datasheet.ciiva.com/1569/1747527-1569238.pdf?src-supplier=Farnell; ComponentLink4URL: https://datasheet.ciiva.com/329/40796-329675.pdf?src-supplier=Digi-Key; ComponentLink4Description: https://datasheet.ciiva.com/329/40796-329675.pdf?src-supplier=Digi-Key; ComponentLink5URL: https://datasheet.ciiva.com/329/40796-329676.pdf?src-supplier=Digi-Key; ComponentLink5Description: https://datasheet.ciiva.com/329/40796-329676.pdf?src-supplier=Digi-Key; ComponentLink6URL: https://datasheet.ciiva.com/329/40796-329677.pdf?src-supplier=Digi-Key; ComponentLink6Description: https://datasheet.ciiva.com/329/40796-329677.pdf?src-supplier=Digi-Key; Supplier Part Number 1: LTC4366IDDB-2#TRMPBFCT-ND
footprint DFN-4 (DFN, 4-Leads, Body 2,00x3,00mm, Pitch 0,50mm, IPC Medium Density)
pins: 1 VSS, 2 TIMER (in), 3 ~{SD} (in), 4 VDD, 5 GATE, 6 OUT, 7 FB (in), 8 BASE (out)

## IC-LTC7004
designator U?, comment LTC7004
IC GATE DRVR HIGH-SIDE 10MSOP; Manufacturer: Analog Devices / Linear Technology; Manufacturer Part Number: LTC7004IMSE#PBF; Supplier 1: Digi-Key; Stock 1: 156; Pricing 1: 1=5,61000, 25=3,22000, 100=3,10300 (USD); RoHS: No; ComponentLink1URL: http://www.analog.com/media/en/technical-documentation/data-sheets/7004fa.pdf?src-supplier=Digi-Key; ComponentLink1Description: http://www.analog.com/media/en/technical-documentation/data-sheets/7004fa.pdf?src-supplier=Digi-Key; Supplier Part Number 1: LTC7004IMSE#PBF-ND
footprint MSOP10 (TSSOP, 10-Leads, Body 3,00x3,00mm, Pitch 0,50mm, IPC Medium Density)
pins: 1 VCC, 2 VCCUV, 3 GND, 4 INP, 5 OVLO, 6 TGDN, 7 TGUP, 8 TS, 9 BST, 10 NC

## IC-LTV-356T
designator U?, comment LTV-356T